# Altium footprint library HeadersPin_1rows_M_90.PcbLib: 40 footprints (part 3 of 3)
Each footprint in its own frame and in the unit in brackets; x right, y up, seen from the top. Pads: shape width x height; smd on the part's side, far side on the other; paste and mask are expansions set on the pad; w line width, h text height; cw(c..) or ccw(c..) is an arc to the next point about the centre after c.
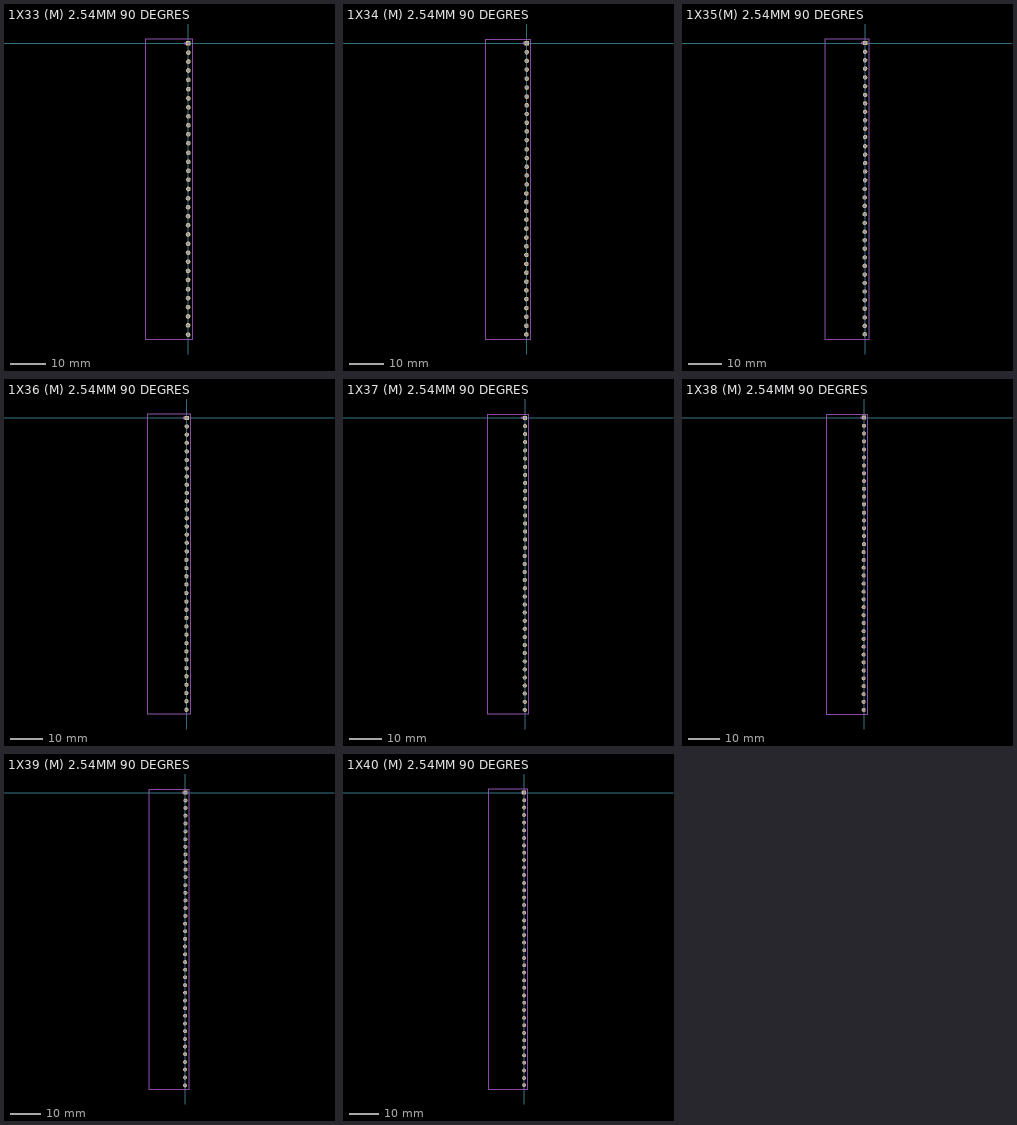
[diagram p2: the footprints below, top view; thin cyan lines are the x and y axes]

## 1X33 (M) 2.54MM 90 DEGRES [mm]
pads (33):
  rect 1.3x1.3 hole 0.9 mask+0.05: 1(0,0)
  round 1.3 hole 0.9 mask+0.05: 2(0,-2.6) 3(0,-5.1) 4(0,-7.6) 5(0,-10.2) 6(0,-12.8) 7(0,-15.4) 8(0,-17.9) 9(0,-20.4) 10(0,-22.9) 11(0,-25.4) 12(0,-27.9) 13(0,-30.6) 14(0,-33.1) 15(0,-35.6) 16(0,-38.1) 17(0,-40.7) 18(-0.1,-43.3) 19(-0.1,-45.8) 20(-0.1,-48.3) 21(-0.1,-50.8) 22(-0.1,-53.4) 23(-0.1,-56) 24(-0.1,-58.5) 25(-0.1,-61) 26(-0.1,-63.6) 27(-0.1,-66.1) 28(-0.1,-68.7) 29(-0.1,-71.2) 30(-0.1,-73.7) 31(-0.1,-76.3) 32(-0.1,-78.8) 33(-0.1,-81.4)
Mechanical 2:
  circle w0.4: c-0.8,0 r0.2
  lines w0.2: -12.05,-82.6 1.2,-82.6 1.2,1.2 -12.05,1.2 -12.05,-82.6
  text ".Designator" at -4.612,-21.034 h1.52
3D body "1x33 Male Pin Header Angle.STEP": height 2.65, standoff -2.85, extent -12.031,-82.595 0.329,1.23

## 1X34 (M) 2.54MM 90 DEGRES [mm]
pads (34):
  rect 1.3x1.3 hole 0.9 mask+0.05: 1(0,0)
  round 1.3 hole 0.9 mask+0.05: 2(0,-2.6) 3(0,-5.1) 4(0,-7.6) 5(0,-10.2) 6(0,-12.8) 7(0,-15.4) 8(0,-17.9) 9(0,-20.4) 10(0,-22.9) 11(0,-25.4) 12(0,-27.9) 13(0,-30.6) 14(0,-33.1) 15(0,-35.6) 16(0,-38.1) 17(0,-40.7) 18(-0.1,-43.3) 19(-0.1,-45.8) 20(-0.1,-48.3) 21(-0.1,-50.8) 22(-0.1,-53.4) 23(-0.1,-56) 24(-0.1,-58.5) 25(-0.1,-61) 26(-0.1,-63.6) 27(-0.1,-66.1) 28(-0.1,-68.7) 29(-0.1,-71.2) 30(-0.1,-73.7) 31(-0.1,-76.3) 32(-0.1,-78.8) 33(-0.1,-81.4) 34(-0.1,-83.9)
Mechanical 2:
  circle w0.4: c-0.8,0 r0.2
  lines w0.2: -12.007,-85.2 1.2,-85.2 1.2,1.2 -12.007,1.2 -12.007,-85.2
  text ".Designator" at -5.872,-19.903 h1.52
3D body "1x34 Male Pin Header Angle.STEP": height 2.65, standoff -2.85, extent -11.956,-85.092 0.404,1.273

## 1X35(M) 2.54MM 90 DEGRES [mm]
pads (35):
  rect 1.3x1.3 hole 0.9 mask+0.05: 1(0,0)
  round 1.3 hole 0.9 mask+0.05: 2(0,-2.6) 3(0,-5.1) 4(0,-7.6) 5(0,-10.2) 6(0,-12.8) 7(0,-15.4) 8(0,-17.9) 9(0,-20.4) 10(0,-22.9) 11(0,-25.4) 12(0,-27.9) 13(0,-30.6) 14(0,-33.1) 15(0,-35.6) 16(0,-38.1) 17(0,-40.7) 18(-0.1,-43.3) 19(-0.1,-45.8) 20(-0.1,-48.3) 21(-0.1,-50.8) 22(-0.1,-53.4) 23(-0.1,-56) 24(-0.1,-58.5) 25(-0.1,-61) 26(-0.1,-63.6) 27(-0.1,-66.1) 28(-0.1,-68.7) 29(-0.1,-71.2) 30(-0.1,-73.7) 31(-0.1,-76.3) 32(-0.1,-78.8) 33(-0.1,-81.4) 34(-0.1,-83.9) 35(-0.1,-86.4)
Mechanical 2:
  circle w0.4: c-0.8,0 r0.2
  lines w0.2: -11.933,-87.8 -11.933,1.2 1.2,1.2 1.2,-87.8 -11.933,-87.8
  text ".Designator" at -4.524,-14.351 h1.52
3D body "1x35 Male Pin Header Angle.STEP": height 2.65, standoff -2.85, extent -12.023,-87.683 0.337,1.222

## 1X36 (M) 2.54MM 90 DEGRES [mm]
pads (36):
  rect 1.3x1.3 hole 0.9 mask+0.05: 1(0,0)
  round 1.3 hole 0.9 mask+0.05: 2(0,-2.6) 3(0,-5.1) 4(0,-7.6) 5(0,-10.2) 6(0,-12.8) 7(0,-15.4) 8(0,-17.9) 9(0,-20.4) 10(0,-22.9) 11(0,-25.4) 12(0,-27.9) 13(0,-30.6) 14(0,-33.1) 15(0,-35.6) 16(0,-38.1) 17(0,-40.7) 18(-0.1,-43.3) 19(-0.1,-45.8) 20(-0.1,-48.3) 21(-0.1,-50.8) 22(-0.1,-53.4) 23(-0.1,-56) 24(-0.1,-58.5) 25(-0.1,-61) 26(-0.1,-63.6) 27(-0.1,-66.1) 28(-0.1,-68.7) 29(-0.1,-71.2) 30(-0.1,-73.7) 31(-0.1,-76.3) 32(-0.1,-78.8) 33(-0.1,-81.4) 34(-0.1,-83.9) 35(-0.1,-86.4) 36(-0.1,-89)
Mechanical 2:
  circle w0.4: c-0.8,0 r0.2
  lines w0.2: -12.042,-90.3 -12.042,1.2 1.2,1.2 1.2,-90.3 -12.042,-90.3
  text ".Designator" at -4.135,-21.824 h1.52
3D body "1x36 Male Pin Header Angle.STEP": height 2.65, standoff -2.85, extent -12.016,-90.165 0.344,1.28

## 1X37 (M) 2.54MM 90 DEGRES [mm]
pads (37):
  rect 1.3x1.3 hole 0.9 mask+0.05: 1(0,0)
  round 1.3 hole 0.9 mask+0.05: 2(0,-2.6) 3(0,-5.1) 4(0,-7.6) 5(0,-10.2) 6(0,-12.8) 7(0,-15.4) 8(0,-17.9) 9(0,-20.4) 10(0,-22.9) 11(0,-25.4) 12(0,-27.9) 13(0,-30.6) 14(0,-33.1) 15(0,-35.6) 16(0,-38.1) 17(0,-40.7) 18(-0.1,-43.3) 19(-0.1,-45.8) 20(-0.1,-48.3) 21(-0.1,-50.8) 22(-0.1,-53.4) 23(-0.1,-56) 24(-0.1,-58.5) 25(-0.1,-61) 26(-0.1,-63.6) 27(-0.1,-66.1) 28(-0.1,-68.7) 29(-0.1,-71.2) 30(-0.1,-73.7) 31(-0.1,-76.3) 32(-0.1,-78.8) 33(-0.1,-81.4) 34(-0.1,-83.9) 35(-0.1,-86.4) 36(-0.1,-89) 37(-0.1,-91.5)
Mechanical 2:
  circle w0.4: c-0.8,0 r0.2
  lines w0.2: -11.93,-92.8 -11.93,1.2 1.2,1.2 1.2,-92.8 -11.93,-92.8
  text ".Designator" at -5.71,-14.613 h1.52
3D body "1x37 Male Pin Header Angle.STEP": height 2.65, standoff -2.85, extent -12.025,-92.743 0.335,1.242

## 1X38 (M) 2.54MM 90 DEGRES [mm]
pads (38):
  rect 1.3x1.3 hole 0.9 mask+0.05: 1(0,0)
  round 1.3 hole 0.9 mask+0.05: 2(0,-2.6) 3(0,-5.1) 4(0,-7.6) 5(0,-10.2) 6(0,-12.8) 7(0,-15.4) 8(0,-17.9) 9(0,-20.4) 10(0,-22.9) 11(0,-25.4) 12(0,-27.9) 13(0,-30.6) 14(0,-33.1) 15(0,-35.6) 16(0,-38.1) 17(0,-40.7) 18(-0.1,-43.3) 19(-0.1,-45.8) 20(-0.1,-48.3) 21(-0.1,-50.8) 22(-0.1,-53.4) 23(-0.1,-56) 24(-0.1,-58.5) 25(-0.1,-61) 26(-0.1,-63.6) 27(-0.1,-66.1) 28(-0.1,-68.7) 29(-0.1,-71.2) 30(-0.1,-73.7) 31(-0.1,-76.3) 32(-0.1,-78.8) 33(-0.1,-81.4) 34(-0.1,-83.9) 35(-0.1,-86.4) 36(-0.1,-89) 37(-0.1,-91.5) 38(-0.1,-94.1)
Mechanical 2:
  circle w0.4: c-0.8,0 r0.2
  lines w0.2: -12.149,-95.4 -12.149,1.2 1.2,1.2 1.2,-95.4 -12.149,-95.4
  text ".Designator" at -6.279,-14.544 h1.52
3D body "1x38 Male Pin Header Angle.STEP": height 2.65, standoff -2.85, extent -12.016,-95.318 0.344,1.207

## 1X39 (M) 2.54MM 90 DEGRES [mm]
pads (39):
  rect 1.3x1.3 hole 0.9 mask+0.05: 1(0,0)
  round 1.3 hole 0.9 mask+0.05: 2(0,-2.6) 3(0,-5.1) 4(0,-7.6) 5(0,-10.2) 6(0,-12.8) 7(0,-15.4) 8(0,-17.9) 9(0,-20.4) 10(0,-22.9) 11(0,-25.4) 12(0,-27.9) 13(0,-30.6) 14(0,-33.1) 15(0,-35.6) 16(0,-38.1) 17(0,-40.7) 18(-0.1,-43.3) 19(-0.1,-45.8) 20(-0.1,-48.3) 21(-0.1,-50.8) 22(-0.1,-53.4) 23(-0.1,-56) 24(-0.1,-58.5) 25(-0.1,-61) 26(-0.1,-63.6) 27(-0.1,-66.1) 28(-0.1,-68.7) 29(-0.1,-71.2) 30(-0.1,-73.7) 31(-0.1,-76.3) 32(-0.1,-78.8) 33(-0.1,-81.4) 34(-0.1,-83.9) 35(-0.1,-86.4) 36(-0.1,-89) 37(-0.1,-91.5) 38(-0.1,-94.1) 39(-0.1,-96.7)
Mechanical 2:
  circle w0.4: c-0.8,0 r0.2
  lines w0.2: -12.06,-97.9 -12.06,1.2 1.2,1.2 1.2,-97.9 -12.06,-97.9
  text ".Designator" at -5.641,-14.978 h1.52
3D body "1x39 Male Pin Header Angle.STEP": height 2.65, standoff -2.85, extent -12.083,-97.833 0.277,1.232

## 1X40 (M) 2.54MM 90 DEGRES [mm]
pads (40):
  rect 1.3x1.3 hole 0.9 mask+0.05: 1(0,0)
  round 1.3 hole 0.9 mask+0.05: 2(0,-2.6) 3(0,-5.1) 4(0,-7.6) 5(0,-10.2) 6(0,-12.8) 7(0,-15.4) 8(0,-17.9) 9(0,-20.4) 10(0,-22.9) 11(0,-25.4) 12(0,-27.9) 13(0,-30.6) 14(0,-33.1) 15(0,-35.6) 16(0,-38.1) 17(0,-40.7) 18(0,-43.3) 19(0,-45.8) 20(0,-48.3) 21(0,-50.8) 22(0,-53.4) 23(0,-56) 24(0,-58.5) 25(0,-61) 26(0,-63.6) 27(0,-66.1) 28(0,-68.7) 29(0,-71.2) 30(0,-73.7) 31(0,-76.3) 32(0,-78.8) 33(0,-81.4) 34(0,-83.9) 35(0,-86.4) 36(0,-89) 37(0,-91.5) 38(0,-94.1) 39(0,-96.7) 40(0,-99.1)
Mechanical 2:
  circle w0.4: c-0.8,0 r0.2
  lines w0.2: -12.136,-100.4 -12.136,1.2 1.2,1.2 1.2,-100.4 -12.136,-100.4
  text ".Designator" at -4.963,-15.309 h1.52
3D body "1x40 Male Pin Header Angle.STEP": height 2.65, standoff -2.85, extent -12.096,-100.315 0.264,1.29